# Altium footprint library 我的元件库01.PcbLib: 321 footprints (part 10 of 21)
Each footprint in its own frame and in the unit in brackets; x right, y up, seen from the top. Pads: shape width x height; smd on the part's side, far side on the other; paste and mask are expansions set on the pad; w line width, h text height; cw(c..) or ccw(c..) is an arc to the next point about the centre after c.
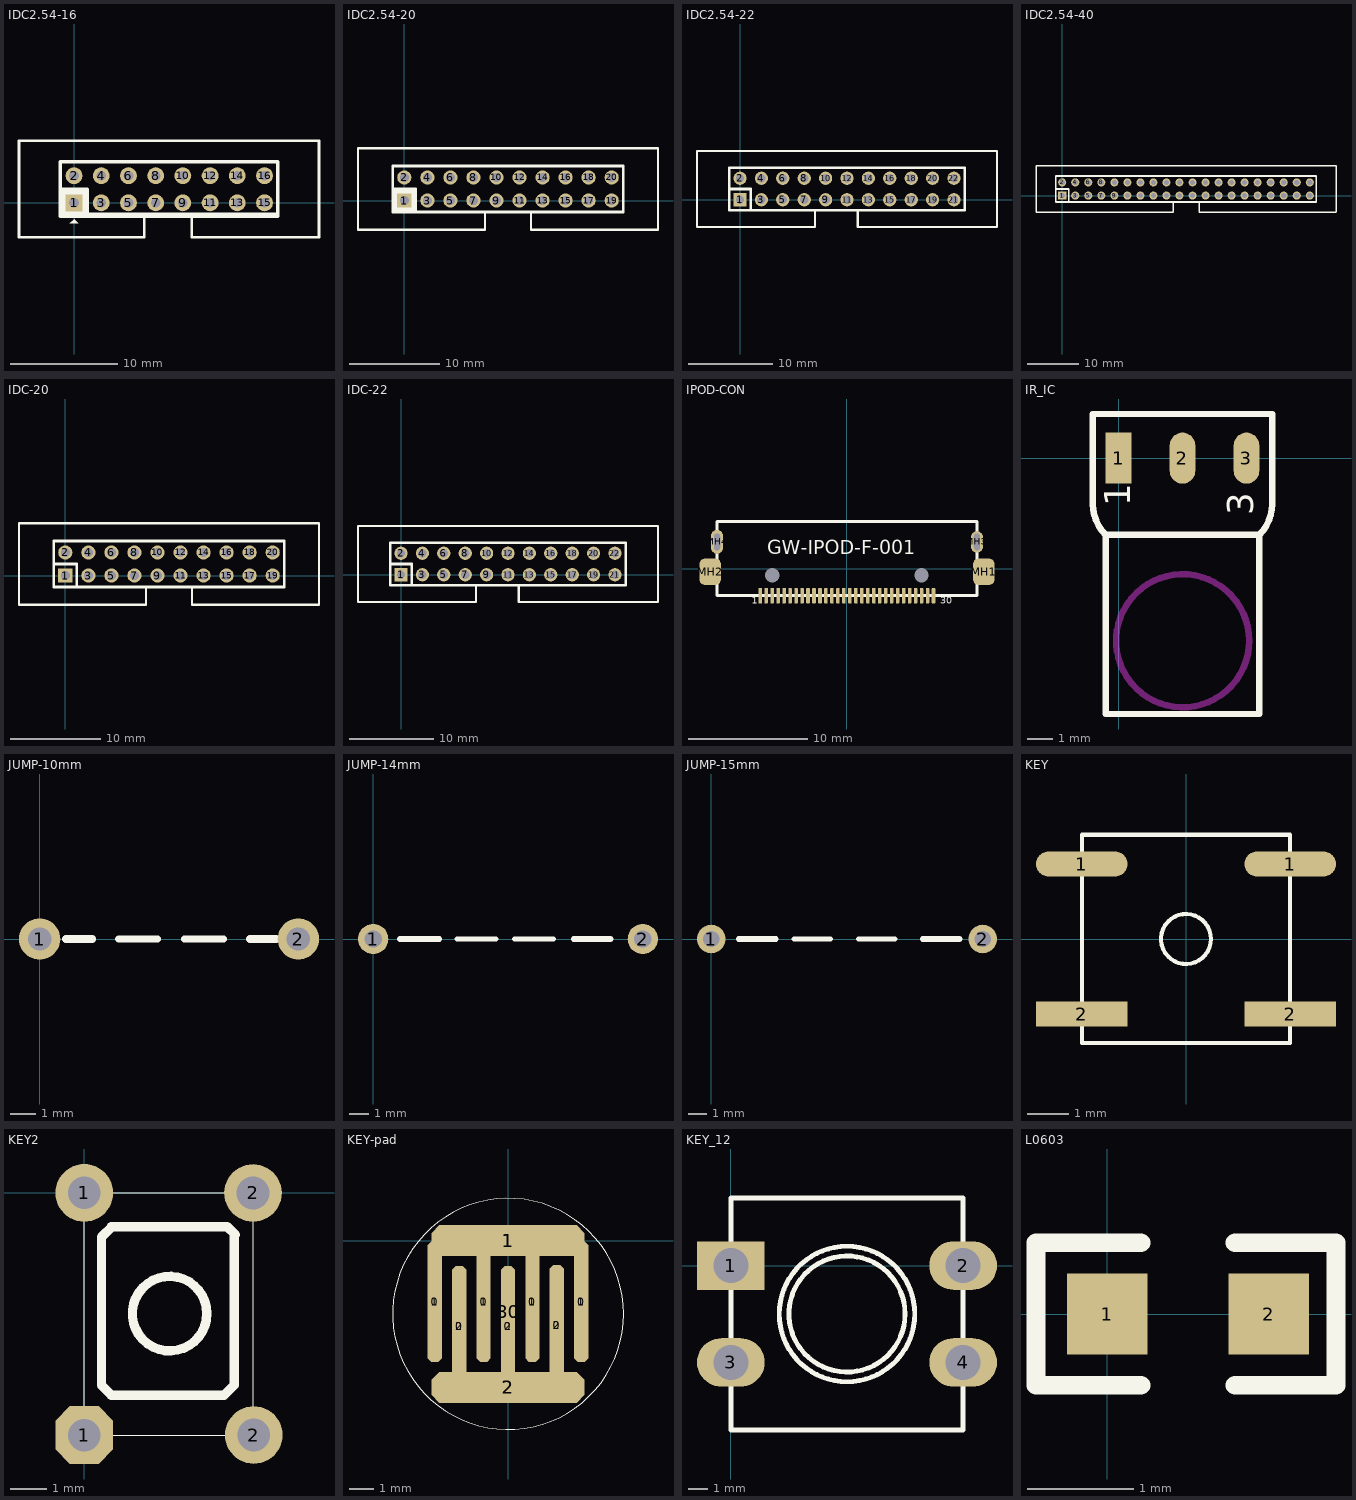
[diagram p9: the footprints below, top view; thin cyan lines are the x and y axes]

## IDC2.54-16 [mil]
pads (16):
  rect 62x62 hole 35.43: 1(0,0)
  round 62 hole 35.43: 2(0,100) 3(100,0) 4(100,100) 5(200,0) 6(200,100) 7(300,0) 8(300,100) 9(400,0) 10(400,100) 11(500,0) 12(500,100) 13(600,0) 14(600,100) 15(700,0) 16(700,100)
Top Overlay:
  rectangle: -51,-49 48,53
  region: -15,-75 15,-75 0,-60
  lines w7.87: -50,-40 750,-40
  lines w10: 258,-49 258,-126.17 -202.18,-126.17 -202.18,228.16 900.18,228.16 900.18,-126.17 433,-126.17 433,-49
  lines w12: -51,51 49,51 49,-49 ; -51,-49 -51,151 749,151 749,-49 -51,-49

## IDC2.54-20 [mil]
pads (20):
  rect 62x62 hole 39.37: 1(0,0)
  round 62 hole 39.37: 2(0,100) 3(100,0) 4(100,100) 5(200,0) 6(200,100) 7(300,0) 8(300,100) 9(400,0) 10(400,100) 11(500,0) 12(500,100) 13(600,0) 14(600,100) 15(700,0) 16(700,100) 17(800,0) 18(800,100) 19(900,0) 20(900,100)
Top Overlay:
  rectangle: -50,-50 49,52
  lines w10: 350,-50 350,-127.17 -201.18,-127.17 -201.18,227.16 1101.18,227.16 1101.18,-127.17 550,-127.17 550,-50
  lines w12: -50,50 50,50 50,-50 ; -50,-50 950,-50 950,150 -50,150 -50,-50
3D body "SW3dPS-BH-20.STEP": height 352.36, standoff -114.17, extent -201,-123.27 1099,235

## IDC2.54-22 [mil]
pads (22):
  rect 62x62 hole 39.37: 1(0,0)
  round 62 hole 39.37: 2(0,100) 3(100,0) 4(100,100) 5(200,0) 6(200,100) 7(300,0) 8(300,100) 9(400,0) 10(400,100) 11(500,0) 12(500,100) 13(600,0) 14(600,100) 15(700,0) 16(700,100) 17(800,0) 18(800,100) 19(900,0) 20(900,100) 21(1000,0) 22(1000,100)
Top Overlay:
  lines w10: 350,-50 350,-127.17 -201.18,-127.17 -201.18,227.16 1201.18,227.16 1201.18,-127.17 550,-127.17 550,-50
  lines w12: -50,50 50,50 50,-50 ; -50,-50 1050,-50 1050,150 -50,150 -50,-50

## IDC2.54-40 [mil]
pads (40):
  rect 62x62 hole 39.37: 1(0,0)
  round 62 hole 39.37: 2(0,100) 3(100,0) 4(100,100) 5(200,0) 6(200,100) 7(300,0) 8(300,100) 9(400,0) 10(400,100) 11(500,0) 12(500,100) 13(600,0) 14(600,100) 15(700,0) 16(700,100) 17(800,0) 18(800,100) 19(900,0) 20(900,100) 21(1000,0) 22(1000,100) 23(1100,0) 24(1100,100) 25(1200,0) 26(1200,100) 27(1300,0) 28(1300,100) 29(1400,0) 30(1400,100) 31(1500,0) 32(1500,100) 33(1600,0) 34(1600,100) 35(1700,0) 36(1700,100) 37(1800,0) 38(1800,100) 39(1900,0) 40(1900,100)
Top Overlay:
  lines w10: 851,-50 851,-127.17 -201.18,-127.17 -201.18,227.16 2101.18,227.16 2101.18,-127.17 ; 1051,-50 1051,-127.17 2101,-127.17
  lines w12: -50,50 50,50 50,-50 ; 1948,-50 -50,-50 -50,150 1950,150 ; 1950,50 1950,-50 ; 1950,-50 1950,150 ; 1950,-50 1950,150
3D body "SW3dPS-HDB-40.STEP": height 366.14, standoff -98.43, extent -196.64,-126.08 2098.64,244

## IDC-20 [mil]
pads (20):
  rect 62x62 hole 39.37: 1(0,0)
  round 62 hole 39.37: 2(0,100) 3(100,0) 4(100,100) 5(200,0) 6(200,100) 7(300,0) 8(300,100) 9(400,0) 10(400,100) 11(500,0) 12(500,100) 13(600,0) 14(600,100) 15(700,0) 16(700,100) 17(800,0) 18(800,100) 19(900,0) 20(900,100)
Top Overlay:
  lines w10: 350,-50 350,-127.17 -201.18,-127.17 -201.18,227.16 1101.18,227.16 1101.18,-127.17 550,-127.17 550,-50
  lines w12: -50,50 50,50 50,-50 ; -50,-50 950,-50 950,150 -50,150 -50,-50
3D body "SW3dPS-BH-20.STEP": height 352.36, standoff -114.17, extent -201,-123.27 1099,235

## IDC-22 [mil]
pads (22):
  rect 62x62 hole 39.37: 1(0,0)
  round 62 hole 39.37: 2(0,100) 3(100,0) 4(100,100) 5(200,0) 6(200,100) 7(300,0) 8(300,100) 9(400,0) 10(400,100) 11(500,0) 12(500,100) 13(600,0) 14(600,100) 15(700,0) 16(700,100) 17(800,0) 18(800,100) 19(900,0) 20(900,100) 21(1000,0) 22(1000,100)
Top Overlay:
  lines w10: 350,-50 350,-127.17 -201.18,-127.17 -201.18,227.16 1201.18,227.16 1201.18,-127.17 550,-127.17 550,-50
  lines w12: -50,50 50,50 50,-50 ; -50,-50 -50,150 1050,150 1050,-50 -50,-50

## IPOD-CON [mm]
height 2.5
pads (36):
  rect 0.3x1.3 smd: 1(-7.261,-2.25)
  rrect50% 0.3x1.3 smd: 2(-6.761,-2.25) 3(-6.261,-2.25) 4(-5.761,-2.25) 5(-5.261,-2.25) 6(-4.761,-2.25) 7(-4.261,-2.25) 8(-3.761,-2.25) 9(-3.261,-2.25) 10(-2.761,-2.25) 11(-2.261,-2.25) 12(-1.761,-2.25) 13(-1.261,-2.25) 14(-0.761,-2.25) 15(-0.261,-2.25) 16(0.239,-2.25) 17(0.739,-2.25) 18(1.239,-2.25) 19(1.739,-2.25) 20(2.239,-2.25) 21(2.739,-2.25) 22(3.239,-2.25) 23(3.739,-2.25) 24(4.239,-2.25) 25(4.739,-2.25) 26(5.239,-2.25) 27(5.739,-2.25) 28(6.239,-2.25) 29(6.739,-2.25) 30(7.239,-2.25)
  rrect50% 1.8x2.2 smd: MH1(11.45,-0.25) MH2(-11.45,-0.25)
  oval 1x1.8 hole 0.5 slot 1.4 at 90 deg: MH3(10.875,2.25)
  oval 1x2 hole 0.5 slot 1.4 at 90 deg: MH4(-10.875,2.25)
  rrect50% 0.3x0 hole 1.2: ""(-6.261,-0.55) ""(6.239,-0.55)
Top Overlay:
  lines w0.254: -10.875,-2.25 10.875,-2.25 10.875,3.95 -10.875,3.95 -10.875,-2.25
  text "1" at -7.95,-3.15 h1
  text "30" at 7.798,-3.15 h1
  text "GW-IPOD-F-001" at -6.655,0.813 h2
3D body "User Library-dock_connector.STEP": height 2.2, standoff 0, extent -11.409,-1.968 11.308,3.632

## IR_IC [mm]
pads (3):
  rect 1x2 smd: 1(0,0)
  oval 1x2 smd: 2(2.5,0) 3(5,0)
Top Overlay:
  lines w0.254: -0.5,-3 cw(c0.707,-1.793) -1,-1.793 -1,-1.322 -1,1.726 6,1.726 6,-1.297 6,-1.793 cw(c4.293,-1.793) 5.5,-3 ; -0.5,-3 5.5,-3 ; -0.5,-3 -0.5,-10 5.5,-10 5.5,-3
  text "1" at 0.457,-1.88 h1.02
  text "3" at 5.258,-2.235 h1.02
Keep-Out Layer:
  circle w0.254: c2.505,-7.137 r2.6

## JUMP-10mm [mm]
pads (2):
  round 1.6 hole 0.9: 1(0,0) 2(10,0)
Top Overlay:
  lines w0.254: 3.048,0 4.572,0 ; 5.588,0 7.112,0
  lines w0.305: 1.016,0 2.032,0 ; 8.128,0 9.144,0

## JUMP-14mm [mil]
pads (2):
  round 62 hole 35.43: 1(0,0) 2(551.18,0)
Top Overlay:
  lines w10: 171,0 251,0 ; 289,0 369,0
  lines w12: 55,0 135,0 ; 410,0 485,0

## JUMP-15mm [mil]
pads (2):
  round 62 hole 35.43: 1(0,0) 2(590.55,0)
Top Overlay:
  lines w10: 180,0 260,0 ; 320,0 400,0
  lines w12: 60,0 140,0 ; 460,0 540,0

## KEY [mm]
pads (4):
  oval 2.2x0.6 smd: 1(-2.5,1.8) 1(2.5,1.8)
  rect 2.2x0.6 smd: 2(-2.5,-1.8) 2(2.5,-1.8)
Top Overlay:
  circle w0.1: c0,0 r0.6
  lines w0.1: -2.5,-2.5 -2.5,2.5 2.5,2.5 2.5,-2.5 -2.5,-2.5

## KEY2 [mil]
pads (4):
  oct 62x62 hole 35: 1(0,-259.93)
  round 62 hole 35: 1(0,0) 2(181.1,-0.09) 2(181.89,-259.84)
Top Overlay:
  circle w10: c91.61,-129.56 r40
  lines w1: 181.1,6.13 181.1,-259.93 0,-259.93 0,-0.09 184.55,-0.09
  lines w10: 29.12,-36.39 152.35,-36.39 ; 29.91,-36 18.5,-47.41 18.5,-48.99 18.5,-206.47 29.12,-217.1 149.99,-217.1 161.01,-206.07 161.01,-61.98 161.01,-44.26 ; 153.14,-36 162.19,-45.05

## KEY-pad [mm]
pads (19):
  oct 0.6x5 on Top Paste: 0(-3.048,-2.54) 0(-2.032,-3.556) 0(-1.011,-2.54) 0(0,-3.556) 0(1.016,-2.54) 0(2.032,-3.505) 0(3.048,-2.54)
  oct 0.6x5 smd: 1(-3.048,-2.54) 1(-1.016,-2.54) 1(1.016,-2.54) 1(3.048,-2.54) 2(-2.032,-3.556) 2(0,-3.556) 2(2.032,-3.505)
  oct 6.35x1.27 smd: 1(0,0) 2(0,-6.096)
  oct 6.35x1.27 on Top Paste: 1(0,0) 2(0,-6.096)
  rect 6.5x6.6 on Top Solder: 80(0.002,-2.953)
Top Overlay:
  circle w0.025: c0.005,-3.043 r4.792

## KEY_12 [mm]
pads (4):
  rect 3.5x2.5 hole 1.8: 1(0,0)
  oval 3.5x2.5 hole 1.8: 2(12,0) 3(0,-5) 4(12,-5)
Top Overlay:
  circle w0.254: c6,-2.5 r3.5
  circle w0.254: c6,-2.5 r3
  lines w0.254: 0,-8.5 0,3.5 12,3.5 12,-8.5 0,-8.5

## L0603 [mil]
pads (2):
  rect 30x30 smd: 1(0,0) 2(60,0)
Top Overlay:
  lines w7: -26.5,26.5 -26.5,-26.5 12.5,-26.5 ; -25,26.5 12.5,26.5 ; 47.5,-26.5 85,-26.5 85,26.5 47.5,26.5
3D body "R0603.STEP": height 17.72, standoff 0, extent -1,-16 61.99,15.5